# Altium footprint library EPCOS.PcbLib: 178 footprints (part 12 of 12)
Each footprint in its own frame and in the unit in brackets; x right, y up, seen from the top. Pads: shape width x height; smd on the part's side, far side on the other; paste and mask are expansions set on the pad; w line width, h text height; cw(c..) or ccw(c..) is an arc to the next point about the centre after c.
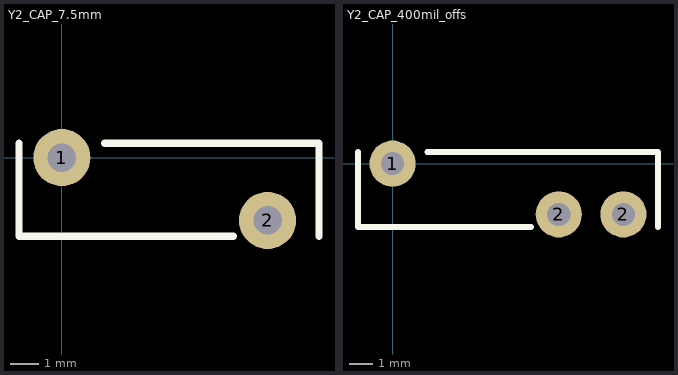
[diagram p11: the footprints below, top view; thin cyan lines are the x and y axes]

## Y2_CAP_7.5mm [mm]
height 12
pads (2):
  round 2 hole 1: 1(0,0) 2(7.2,-2.2)
Top Overlay:
  lines w0.254: -1.5,0.5 -1.5,-2.75 6,-2.75 ; 1.5,0.5 9,0.5 9,-2.75
3D body "User Library-Cap_Y2.step": height 10.6, standoff -1, extent -0.3,-3.2 7.5,1

## Y2_CAP_400mil_offs [mm]
height 12.7
pads (3):
  round 2 hole 1: 1(0,0) 2(7.2,-2.2) 2(10,-2.2)
Top Overlay:
  lines w0.254: -1.5,0.5 -1.5,-2.75 6,-2.75 ; 1.5,0.5 11.5,0.5 11.5,-2.75
3D body "User Library-Cap_Y2.step": height 10.6, standoff -1, extent -0.3,-3.2 7.5,1